# Altium footprint library Nixie_PCB.PcbLib: 36 footprints (part 3 of 3)
Each footprint in its own frame and in the unit in brackets; x right, y up, seen from the top. Pads: shape width x height; smd on the part's side, far side on the other; paste and mask are expansions set on the pad; w line width, h text height; cw(c..) or ccw(c..) is an arc to the next point about the centre after c.
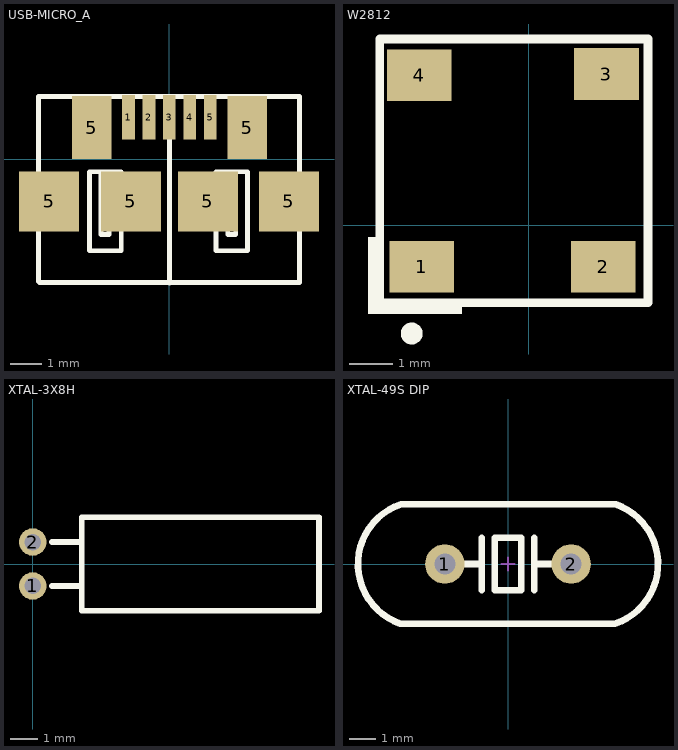
[diagram p2: the footprints below, top view; thin cyan lines are the x and y axes]

## USB-MICRO_A [mm] "micro型USB ，5.9*8.2*2.5mm"
pads (11):
  rect 0.4x1.4 smd: 1(-1.283,1.333) 2(-0.635,1.333) 3(0.013,1.333) 4(0.66,1.333) 5(1.308,1.333)
  rect 1.9x1.9 smd: 5(-3.797,-1.333) 5(-1.206,-1.333) 5(1.232,-1.333) 5(3.797,-1.333)
  rect 1.25x2 smd: 5(-2.451,1.003) 5(2.476,1.003)
Top Overlay:
  lines w0.152: -4.127,-3.873 -4.127,1.994 ; -4.102,-3.899 4.102,-3.899 ; -4.077,1.994 4.102,1.994 ; -2.152,-0.394 -2.152,-2.379 -1.949,-2.379 -1.898,-2.379 -1.898,-0.394 ; 0.013,-3.91 0.013,1.968 ; 1.861,-0.394 1.861,-2.379 2.115,-2.379 2.115,-0.394 ; 4.127,-3.899 4.127,1.994 ; -2.513,-2.894 -1.513,-2.894 -1.513,-0.394 -2.513,-0.394 -2.513,-2.894 ; 1.487,-2.894 1.487,-0.394 2.487,-0.394 2.487,-2.894 1.487,-2.894
3D body "MICRO USB.STEP": height 2.77, standoff -0.17, extent -4.1,-3.912 4.1,2.018

## W2812 [mm]
pads (4):
  rect 1.5x1.2 smd: 1(-2.489,-0.97) 2(1.727,-0.97) 3(1.803,3.505) 4(-2.54,3.48)
Top Overlay:
  circle w0.254: c-2.718,-2.519 r0.127
  rectangle: -3.556,-2.062 -1.549,-1.808
  rectangle: -3.734,-2.062 -3.556,-0.284
  lines w0.2: -3.46,-1.808 2.769,-1.808 2.769,4.318 -3.46,4.318 -3.46,-1.808
3D body "User Library-APA102C.STEP": height 1.55, standoff 0, extent -3.106,-1.255 2.395,3.745

## XTAL-3X8H [mm]
pads (2):
  round 1 hole 0.6: 1(0,-0.8) 2(0,0.8)
Top Overlay:
  lines w0.203: 0.7,-0.8 1.778,-0.8 ; 0.7,0.8 1.778,0.8 ; 1.778,-1.7 10.414,-1.7 10.414,1.7 1.778,1.7 1.778,-1.7
3D body "3x6h.STEP": height 3.15, standoff -2.85, extent -0.18,-1.5 10.18,1.5

## XTAL-49S DIP [mm]
pads (2):
  round 1.5 hole 0.8: 1(-2.4,0) 2(2.4,0)
Top Overlay:
  lines w0.254: -4.09,-2.275 4.059,-2.275 ccw(c3.298,0.003) 4.09,2.271 ; -4.09,-2.271 cw(c-3.298,-0.003) -4.059,2.275 4.09,2.275 ; -1.6,0 -1,0 ; -1,-1 -1,1 ; 1,-1 1,1 ; 1,0 1.6,0 ; -0.5,-1 -0.5,1 0.5,1 0.5,-1 -0.5,-1
Mechanical 15:
  lines w0.076: -0.254,0 0.254,0 ; 0,-0.254 0,0.254
3D body "SW3dPS-HP49US.STEP": height 3.5, standoff -4, extent -5.675,-2.35 5.675,2.3